# Altium footprint library 6-Connectors-6.PcbLib: 117 footprints (part 2 of 8)
Each footprint in its own frame and in the unit in brackets; x right, y up, seen from the top. Pads: shape width x height; smd on the part's side, far side on the other; paste and mask are expansions set on the pad; w line width, h text height; cw(c..) or ccw(c..) is an arc to the next point about the centre after c.
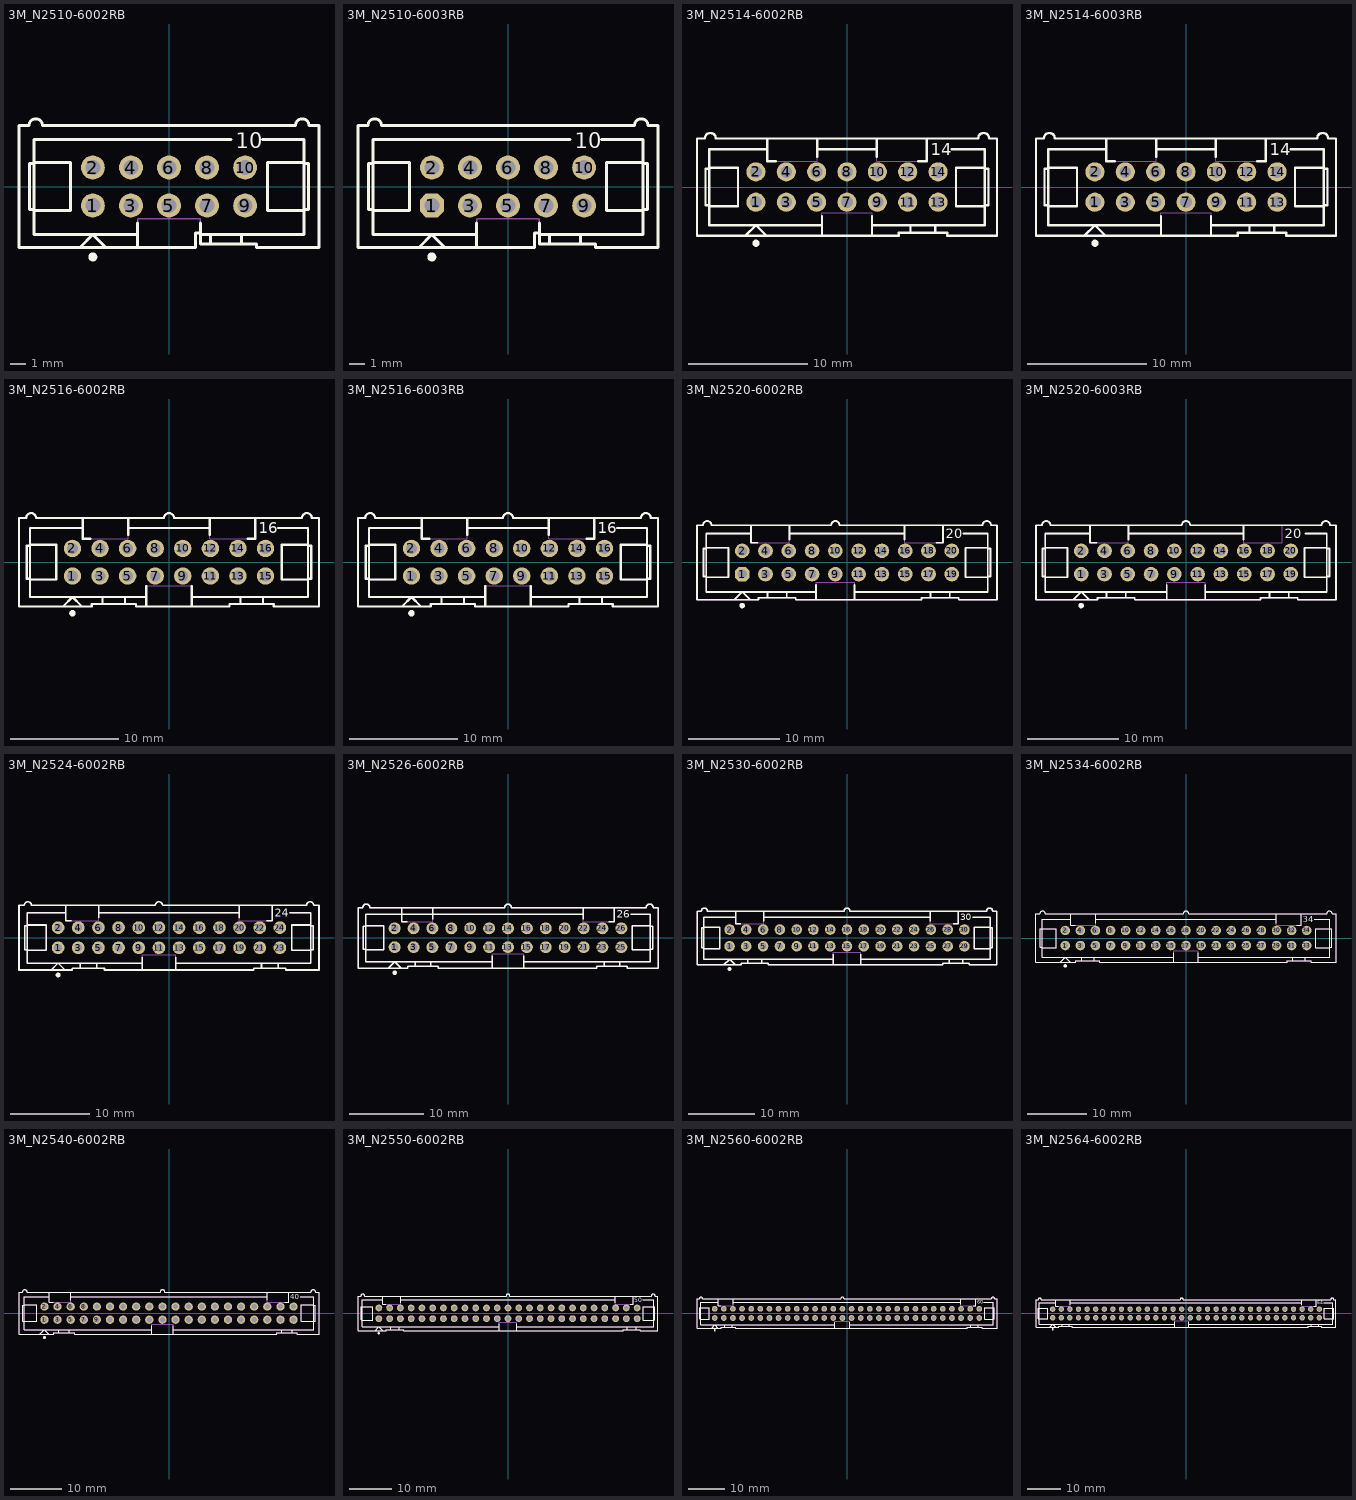
[diagram p1: the footprints below, top view; thin cyan lines are the x and y axes]

## 3M_N2510-6002RB [mm] "10 Contacts - Straight .100\" x .100\" Low Profile Four-Wall Header"
height 10.03
pads (10):
  round 1.6 hole 1: 1(-5.08,-1.27) 2(-5.08,1.27) 3(-2.54,-1.27) 4(-2.54,1.27) 5(0,-1.27) 6(0,1.27) 7(2.54,-1.27) 8(2.54,1.27) 9(5.08,-1.27) 10(5.08,1.27)
Top Overlay:
  circle w0.3: c-5.08,-4.699 r0.15
  lines w0.2: -8.992,-1.603 -6.579,-1.603 -6.579,1.603 -8.992,1.603 ; -8.992,-1.524 -9.296,-1.524 -9.296,1.524 -8.992,1.524 ; -5.944,-4.064 -5.08,-3.2 -4.216,-4.064 ; -2.096,-4.064 -2.096,-2.438 ; -2.096,-3.2 -8.992,-3.2 -8.992,3.15 4.128,3.15 ; 2.095,-3.2 8.992,-3.2 8.992,3.15 6.223,3.15 ; 2.095,-3.102 1.778,-3.102 1.778,-4.064 -10.008,-4.064 -10.008,4.064 -9.347,4.064 cw(c-8.89,4.064) -8.433,4.064 8.433,4.064 cw(c8.89,4.064) 9.347,4.064 10.008,4.064 10.008,-4.064 5.842,-4.064 5.842,-3.835 2.095,-3.835 2.095,-2.438 ; 2.769,-3.835 2.769,-3.2 ; 4.851,-3.835 4.851,-3.2 ; 8.992,-1.603 6.579,-1.603 6.579,1.603 8.992,1.603 ; 8.992,-1.524 9.296,-1.524 9.296,1.524 8.992,1.524
  text "10" at 4.445,2.54 h1.02
Mechanical 14:
  lines w0.1: -8.992,-1.603 -6.579,-1.603 -6.579,1.603 -8.992,1.603 ; -8.992,-1.524 -9.296,-1.524 -9.296,1.524 -8.992,1.524 ; -5.944,-4.064 -5.08,-3.2 -4.216,-4.064 ; -2.096,-4.064 -2.096,-2.159 2.095,-2.159 2.095,-3.835 5.842,-3.835 5.842,-4.064 10.008,-4.064 10.008,4.064 9.347,4.064 ccw(c8.89,4.064) 8.433,4.064 -8.433,4.064 ccw(c-8.89,4.064) -9.347,4.064 -10.008,4.064 -10.008,-4.064 1.778,-4.064 1.778,-3.102 2.095,-3.102 ; -2.096,-3.2 -8.992,-3.2 -8.992,3.15 4.128,3.15 ; 2.095,-3.2 8.992,-3.2 8.992,3.15 6.223,3.15 ; 2.769,-3.835 2.769,-3.2 ; 4.851,-3.835 4.851,-3.2 ; 8.992,-1.603 6.579,-1.603 6.579,1.603 8.992,1.603 ; 8.992,-1.524 9.296,-1.524 9.296,1.524 8.992,1.524
  text "10" at 4.445,2.54 h1.02
3D body "3M_N2510-6002RB.stp": height 9.65, standoff -2.59, extent -10.008,-4.064 10.008,4.572

## 3M_N2510-6003RB [mm] "10 Contacts - Straight .100\" x .100\" Low Profile Four-Wall Header (Solder Tail 3.94mm)"
height 10.03
pads (10):
  oct 1.6x1.6 hole 1: 1(-5.08,-1.27)
  round 1.6 hole 1: 2(-5.08,1.27) 3(-2.54,-1.27) 4(-2.54,1.27) 5(0,-1.27) 6(0,1.27) 7(2.54,-1.27) 8(2.54,1.27) 9(5.08,-1.27) 10(5.08,1.27)
Top Overlay:
  circle w0.3: c-5.08,-4.699 r0.15
  lines w0.2: -8.992,-1.603 -6.579,-1.603 -6.579,1.603 -8.992,1.603 ; -8.992,-1.524 -9.296,-1.524 -9.296,1.524 -8.992,1.524 ; -5.944,-4.064 -5.08,-3.2 -4.216,-4.064 ; -2.096,-4.064 -2.096,-2.438 ; -2.096,-3.2 -8.992,-3.2 -8.992,3.15 4.128,3.15 ; 2.095,-3.2 8.992,-3.2 8.992,3.15 6.223,3.15 ; 2.095,-3.102 1.778,-3.102 1.778,-4.064 -10.008,-4.064 -10.008,4.064 -9.347,4.064 cw(c-8.89,4.064) -8.433,4.064 8.433,4.064 cw(c8.89,4.064) 9.347,4.064 10.008,4.064 10.008,-4.064 5.842,-4.064 5.842,-3.835 2.095,-3.835 2.095,-2.438 ; 2.769,-3.835 2.769,-3.2 ; 4.851,-3.835 4.851,-3.2 ; 8.992,-1.603 6.579,-1.603 6.579,1.603 8.992,1.603 ; 8.992,-1.524 9.296,-1.524 9.296,1.524 8.992,1.524
  text "10" at 4.445,2.54 h1.02
Mechanical 14:
  lines w0.1: -8.992,-1.603 -6.579,-1.603 -6.579,1.603 -8.992,1.603 ; -8.992,-1.524 -9.296,-1.524 -9.296,1.524 -8.992,1.524 ; -5.944,-4.064 -5.08,-3.2 -4.216,-4.064 ; -2.096,-4.064 -2.096,-2.159 2.095,-2.159 2.095,-3.835 5.842,-3.835 5.842,-4.064 10.008,-4.064 10.008,4.064 9.347,4.064 ccw(c8.89,4.064) 8.433,4.064 -8.433,4.064 ccw(c-8.89,4.064) -9.347,4.064 -10.008,4.064 -10.008,-4.064 1.778,-4.064 1.778,-3.102 2.095,-3.102 ; -2.096,-3.2 -8.992,-3.2 -8.992,3.15 4.128,3.15 ; 2.095,-3.2 8.992,-3.2 8.992,3.15 6.223,3.15 ; 2.769,-3.835 2.769,-3.2 ; 4.851,-3.835 4.851,-3.2 ; 8.992,-1.603 6.579,-1.603 6.579,1.603 8.992,1.603 ; 8.992,-1.524 9.296,-1.524 9.296,1.524 8.992,1.524
  text "10" at 4.445,2.54 h1.02
3D body "3M_N2510-6003RB.stp": height 9.65, standoff -3.1, extent -10.008,-4.064 10.008,4.572
3D body "m20-254via.stp": height 0.1, standoff -1.82, extent -5.93,-2.12 -4.23,-0.42
3D body "m20-254via.stp": height 0.1, standoff -1.82, extent -5.93,0.42 -4.23,2.12
3D body "m20-254via.stp": height 0.1, standoff -1.82, extent -3.39,0.42 -1.69,2.12
3D body "m20-254via.stp": height 0.1, standoff -1.82, extent -3.39,-2.12 -1.69,-0.42
3D body "m20-254via.stp": height 0.1, standoff -1.82, extent -0.85,-2.12 0.85,-0.42
3D body "m20-254via.stp": height 0.1, standoff -1.82, extent -0.85,0.42 0.85,2.12
3D body "m20-254via.stp": height 0.1, standoff -1.82, extent 1.69,-2.12 3.39,-0.42
3D body "m20-254via.stp": height 0.1, standoff -1.82, extent 1.69,0.42 3.39,2.12
3D body "m20-254via.stp": height 0.1, standoff -1.82, extent 4.23,0.42 5.93,2.12
3D body "m20-254via.stp": height 0.1, standoff -1.82, extent 4.23,-2.12 5.93,-0.42

## 3M_N2514-6002RB [mm] "14 Contacts - Straight .100\" x .100\" Low Profile Four-Wall Header"
height 10.03
pads (14):
  round 1.6 hole 1: 1(-7.62,-1.27) 2(-7.62,1.27) 3(-5.08,-1.27) 4(-5.08,1.27) 5(-2.54,-1.27) 6(-2.54,1.27) 7(0,-1.27) 8(0,1.27) 9(2.54,-1.27) 10(2.54,1.27) 11(5.08,-1.27) 12(5.08,1.27) 13(7.62,-1.27) 14(7.62,1.27)
Top Overlay:
  circle w0.3: c-7.62,-4.699 r0.15
  lines w0.2: -11.532,-1.603 -9.119,-1.603 -9.119,1.603 -11.532,1.603 ; -11.532,-1.524 -11.836,-1.524 -11.836,1.524 -11.532,1.524 ; -8.484,-4.064 -7.62,-3.2 -6.756,-4.064 ; -6.668,3.15 -11.532,3.15 -11.532,-3.2 -2.096,-3.2 ; -6.668,4.064 -6.668,2.159 -5.959,2.159 ; -2.477,2.518 -2.477,4.064 ; -2.477,3.15 2.476,3.15 ; -2.096,-4.064 -2.096,-2.438 ; 2.095,-4.064 2.095,-2.438 ; 2.095,-3.2 11.532,-3.2 11.532,3.15 8.763,3.15 ; 2.476,2.518 2.476,4.064 ; 5.309,-3.835 5.309,-3.2 ; 5.959,2.159 6.668,2.159 6.668,4.064 ; 7.391,-3.835 7.391,-3.2 ; 11.532,-1.603 9.119,-1.603 9.119,1.603 11.532,1.603 ; 11.532,-1.524 11.836,-1.524 11.836,1.524 11.532,1.524 ; -12.548,-4.064 -12.548,4.064 -11.887,4.064 cw(c-11.43,4.064) -10.973,4.064 10.973,4.064 cw(c11.43,4.064) 11.887,4.064 12.548,4.064 12.548,-4.064 8.382,-4.064 8.382,-3.835 4.318,-3.835 4.318,-4.064 -12.548,-4.064
  text "14" at 6.985,2.667 h1.02
Mechanical 14:
  lines w0.1: -11.532,-1.603 -9.119,-1.603 -9.119,1.603 -11.532,1.603 ; -11.532,-1.524 -11.836,-1.524 -11.836,1.524 -11.532,1.524 ; -8.484,-4.064 -7.62,-3.2 -6.756,-4.064 ; -6.668,3.15 -11.532,3.15 -11.532,-3.2 -2.096,-3.2 ; -6.668,4.064 -6.668,2.159 -2.477,2.159 -2.477,4.064 ; -2.477,3.15 2.476,3.15 ; -2.096,-4.064 -2.096,-2.159 2.095,-2.159 2.095,-4.064 ; 2.095,-3.2 11.532,-3.2 11.532,3.15 8.763,3.15 ; 2.476,4.064 2.476,2.159 6.668,2.159 6.668,4.064 ; 5.309,-3.835 5.309,-3.2 ; 7.391,-3.835 7.391,-3.2 ; 11.532,-1.603 9.119,-1.603 9.119,1.603 11.532,1.603 ; 11.532,-1.524 11.836,-1.524 11.836,1.524 11.532,1.524 ; -12.548,-4.064 -12.548,4.064 -11.887,4.064 cw(c-11.43,4.064) -10.973,4.064 10.973,4.064 cw(c11.43,4.064) 11.887,4.064 12.548,4.064 12.548,-4.064 8.382,-4.064 8.382,-3.835 4.318,-3.835 4.318,-4.064 -12.548,-4.064
  text "14" at 6.985,2.667 h1.02
3D body "3M_N2514-6002RB.stp": height 9.65, standoff -2.59, extent -12.548,-4.064 12.548,4.572

## 3M_N2514-6003RB [mm] "14 Contacts - Straight .100\" x .100\" Low Profile Four-Wall Header (Solder Tail 3.94mm)"
height 10.03
pads (14):
  round 1.6 hole 1: 1(-7.62,-1.27) 2(-7.62,1.27) 3(-5.08,-1.27) 4(-5.08,1.27) 5(-2.54,-1.27) 6(-2.54,1.27) 7(0,-1.27) 8(0,1.27) 9(2.54,-1.27) 10(2.54,1.27) 11(5.08,-1.27) 12(5.08,1.27) 13(7.62,-1.27) 14(7.62,1.27)
Top Overlay:
  circle w0.3: c-7.62,-4.699 r0.15
  lines w0.2: -11.532,-1.603 -9.119,-1.603 -9.119,1.603 -11.532,1.603 ; -11.532,-1.524 -11.836,-1.524 -11.836,1.524 -11.532,1.524 ; -8.484,-4.064 -7.62,-3.2 -6.756,-4.064 ; -6.668,3.15 -11.532,3.15 -11.532,-3.2 -2.096,-3.2 ; -6.668,4.064 -6.668,2.159 -5.959,2.159 ; -2.477,2.518 -2.477,4.064 ; -2.477,3.15 2.476,3.15 ; -2.096,-4.064 -2.096,-2.438 ; 2.095,-4.064 2.095,-2.438 ; 2.095,-3.2 11.532,-3.2 11.532,3.15 8.763,3.15 ; 2.476,2.518 2.476,4.064 ; 5.309,-3.835 5.309,-3.2 ; 5.959,2.159 6.668,2.159 6.668,4.064 ; 7.391,-3.835 7.391,-3.2 ; 11.532,-1.603 9.119,-1.603 9.119,1.603 11.532,1.603 ; 11.532,-1.524 11.836,-1.524 11.836,1.524 11.532,1.524 ; -12.548,-4.064 4.318,-4.064 4.318,-3.835 8.382,-3.835 8.382,-4.064 12.548,-4.064 12.548,4.064 11.887,4.064 ccw(c11.43,4.064) 10.973,4.064 -10.973,4.064 ccw(c-11.43,4.064) -11.887,4.064 -12.548,4.064 -12.548,-4.064
  text "14" at 6.985,2.667 h1.02
Mechanical 14:
  lines w0.1: -11.532,-1.603 -9.119,-1.603 -9.119,1.603 -11.532,1.603 ; -11.532,-1.524 -11.836,-1.524 -11.836,1.524 -11.532,1.524 ; -8.484,-4.064 -7.62,-3.2 -6.756,-4.064 ; -6.668,3.15 -11.532,3.15 -11.532,-3.2 -2.096,-3.2 ; -6.668,4.064 -6.668,2.159 -2.477,2.159 -2.477,4.064 ; -2.477,3.15 2.476,3.15 ; -2.096,-4.064 -2.096,-2.159 2.095,-2.159 2.095,-4.064 ; 2.095,-3.2 11.532,-3.2 11.532,3.15 8.763,3.15 ; 2.476,4.064 2.476,2.159 6.668,2.159 6.668,4.064 ; 5.309,-3.835 5.309,-3.2 ; 7.391,-3.835 7.391,-3.2 ; 11.532,-1.603 9.119,-1.603 9.119,1.603 11.532,1.603 ; 11.532,-1.524 11.836,-1.524 11.836,1.524 11.532,1.524 ; -12.548,-4.064 4.318,-4.064 4.318,-3.835 8.382,-3.835 8.382,-4.064 12.548,-4.064 12.548,4.064 11.887,4.064 ccw(c11.43,4.064) 10.973,4.064 -10.973,4.064 ccw(c-11.43,4.064) -11.887,4.064 -12.548,4.064 -12.548,-4.064
  text "14" at 6.985,2.667 h1.02
3D body "3M_N2514-6003RB.stp": height 9.65, standoff -3.1, extent -12.548,-4.064 12.548,4.572

## 3M_N2516-6002RB [mm] "16 Contacts - Straight .100\" x .100\" Low Profile Four-Wall Header"
height 10.03
pads (16):
  round 1.6 hole 1: 1(-8.89,-1.27) 2(-8.89,1.27) 3(-6.35,-1.27) 4(-6.35,1.27) 5(-3.81,-1.27) 6(-3.81,1.27) 7(-1.27,-1.27) 8(-1.27,1.27) 9(1.27,-1.27) 10(1.27,1.27) 11(3.81,-1.27) 12(3.81,1.27) 13(6.35,-1.27) 14(6.35,1.27) 15(8.89,-1.27) 16(8.89,1.27)
Top Overlay:
  circle w0.3: c-8.89,-4.699 r0.15
  lines w0.2: -12.802,-1.603 -10.389,-1.603 -10.389,1.603 -12.802,1.603 ; -12.802,-1.524 -13.106,-1.524 -13.106,1.524 -12.802,1.524 ; -9.754,-4.064 -8.89,-3.2 -8.026,-4.064 ; -7.938,3.15 -12.802,3.15 -12.802,-3.2 -2.096,-3.2 ; -7.938,4.064 -7.938,2.159 -7.229,2.159 ; -6.121,-3.835 -6.121,-3.2 ; -4.039,-3.835 -4.039,-3.2 ; -3.747,2.518 -3.747,4.064 ; -3.747,3.15 3.747,3.15 ; -2.096,-4.064 -2.096,-2.209 ; 2.095,-4.064 2.095,-2.209 ; 2.095,-3.2 12.802,-3.2 12.802,3.15 10.033,3.15 ; 3.747,2.518 3.747,4.064 ; 6.579,-3.835 6.579,-3.2 ; 7.229,2.159 7.938,2.159 7.938,4.064 ; 8.661,-3.835 8.661,-3.2 ; 12.802,-1.603 10.389,-1.603 10.389,1.603 12.802,1.603 ; 12.802,-1.524 13.106,-1.524 13.106,1.524 12.802,1.524 ; -13.818,-4.064 -7.112,-4.064 -7.112,-3.835 -3.048,-3.835 -3.048,-4.064 5.588,-4.064 5.588,-3.835 9.652,-3.835 9.652,-4.064 13.818,-4.064 13.818,4.064 13.157,4.064 ccw(c12.7,4.064) 12.243,4.064 0.457,4.064 ccw(c0,4.064) -0.457,4.064 -12.243,4.064 ccw(c-12.7,4.064) -13.157,4.064 -13.818,4.064 -13.818,-4.064
  text "16" at 8.255,2.667 h1.02
Mechanical 14:
  lines w0.1: -12.802,-1.603 -10.389,-1.603 -10.389,1.603 -12.802,1.603 ; -12.802,-1.524 -13.106,-1.524 -13.106,1.524 -12.802,1.524 ; -9.754,-4.064 -8.89,-3.2 -8.026,-4.064 ; -7.938,3.15 -12.802,3.15 -12.802,-3.2 -2.096,-3.2 ; -7.938,4.064 -7.938,2.159 -3.747,2.159 -3.747,4.064 ; -6.121,-3.835 -6.121,-3.2 ; -4.039,-3.835 -4.039,-3.2 ; -3.747,3.15 3.747,3.15 ; -2.096,-4.064 -2.096,-2.159 2.095,-2.159 2.095,-4.064 ; 2.095,-3.2 12.802,-3.2 12.802,3.15 10.033,3.15 ; 3.747,4.064 3.747,2.159 7.938,2.159 7.938,4.064 ; 6.579,-3.835 6.579,-3.2 ; 8.661,-3.835 8.661,-3.2 ; 12.802,-1.603 10.389,-1.603 10.389,1.603 12.802,1.603 ; 12.802,-1.524 13.106,-1.524 13.106,1.524 12.802,1.524 ; -13.818,-4.064 -7.112,-4.064 -7.112,-3.835 -3.048,-3.835 -3.048,-4.064 5.588,-4.064 5.588,-3.835 9.652,-3.835 9.652,-4.064 13.818,-4.064 13.818,4.064 13.157,4.064 ccw(c12.7,4.064) 12.243,4.064 0.457,4.064 ccw(c0,4.064) -0.457,4.064 -12.243,4.064 ccw(c-12.7,4.064) -13.157,4.064 -13.818,4.064 -13.818,-4.064
  text "16" at 8.255,2.667 h1.02
3D body "3M_N2516-6002RB.stp": height 9.65, standoff -2.59, extent -13.818,-4.064 13.818,4.572

## 3M_N2516-6003RB [mm] "16 Contacts - Straight .100\" x .100\" Low Profile Four-Wall Header (Solder Tail 3.94mm)"
height 10.03
pads (16):
  round 1.6 hole 1: 1(-8.89,-1.27) 2(-8.89,1.27) 3(-6.35,-1.27) 4(-6.35,1.27) 5(-3.81,-1.27) 6(-3.81,1.27) 7(-1.27,-1.27) 8(-1.27,1.27) 9(1.27,-1.27) 10(1.27,1.27) 11(3.81,-1.27) 12(3.81,1.27) 13(6.35,-1.27) 14(6.35,1.27) 15(8.89,-1.27) 16(8.89,1.27)
Top Overlay:
  circle w0.3: c-8.89,-4.699 r0.15
  lines w0.2: -12.802,-1.603 -10.389,-1.603 -10.389,1.603 -12.802,1.603 ; -12.802,-1.524 -13.106,-1.524 -13.106,1.524 -12.802,1.524 ; -9.754,-4.064 -8.89,-3.2 -8.026,-4.064 ; -7.938,3.15 -12.802,3.15 -12.802,-3.2 -2.096,-3.2 ; -7.938,4.064 -7.938,2.159 -7.229,2.159 ; -6.121,-3.835 -6.121,-3.2 ; -4.039,-3.835 -4.039,-3.2 ; -3.747,2.518 -3.747,4.064 ; -3.747,3.15 3.747,3.15 ; -2.096,-4.064 -2.096,-2.209 ; 2.095,-4.064 2.095,-2.209 ; 2.095,-3.2 12.802,-3.2 12.802,3.15 10.033,3.15 ; 3.747,2.518 3.747,4.064 ; 6.579,-3.835 6.579,-3.2 ; 7.229,2.159 7.938,2.159 7.938,4.064 ; 8.661,-3.835 8.661,-3.2 ; 12.802,-1.603 10.389,-1.603 10.389,1.603 12.802,1.603 ; 12.802,-1.524 13.106,-1.524 13.106,1.524 12.802,1.524 ; -13.818,-4.064 -13.818,4.064 -13.157,4.064 cw(c-12.7,4.064) -12.243,4.064 -0.457,4.064 cw(c0,4.064) 0.457,4.064 12.243,4.064 cw(c12.7,4.064) 13.157,4.064 13.818,4.064 13.818,-4.064 9.652,-4.064 9.652,-3.835 5.588,-3.835 5.588,-4.064 -3.048,-4.064 -3.048,-3.835 -7.112,-3.835 -7.112,-4.064 -13.818,-4.064
  text "16" at 8.255,2.667 h1.02
Mechanical 14:
  lines w0.1: -12.802,-1.603 -10.389,-1.603 -10.389,1.603 -12.802,1.603 ; -12.802,-1.524 -13.106,-1.524 -13.106,1.524 -12.802,1.524 ; -9.754,-4.064 -8.89,-3.2 -8.026,-4.064 ; -7.938,3.15 -12.802,3.15 -12.802,-3.2 -2.096,-3.2 ; -7.938,4.064 -7.938,2.159 -3.747,2.159 -3.747,4.064 ; -6.121,-3.835 -6.121,-3.2 ; -4.039,-3.835 -4.039,-3.2 ; -3.747,3.15 3.747,3.15 ; -2.096,-4.064 -2.096,-2.159 2.095,-2.159 2.095,-4.064 ; 2.095,-3.2 12.802,-3.2 12.802,3.15 10.033,3.15 ; 3.747,4.064 3.747,2.159 7.938,2.159 7.938,4.064 ; 6.579,-3.835 6.579,-3.2 ; 8.661,-3.835 8.661,-3.2 ; 12.802,-1.603 10.389,-1.603 10.389,1.603 12.802,1.603 ; 12.802,-1.524 13.106,-1.524 13.106,1.524 12.802,1.524 ; -13.818,-4.064 -13.818,4.064 -13.157,4.064 cw(c-12.7,4.064) -12.243,4.064 -0.457,4.064 cw(c0,4.064) 0.457,4.064 12.243,4.064 cw(c12.7,4.064) 13.157,4.064 13.818,4.064 13.818,-4.064 9.652,-4.064 9.652,-3.835 5.588,-3.835 5.588,-4.064 -3.048,-4.064 -3.048,-3.835 -7.112,-3.835 -7.112,-4.064 -13.818,-4.064
  text "16" at 8.255,2.667 h1.02
3D body "3M_N2516-6003RB.stp": height 9.65, standoff -3.1, extent -13.818,-4.064 13.818,4.572

## 3M_N2520-6002RB [mm] "20 Contacts - Straight .100\" x .100\" Low Profile Four-Wall Header"
height 10.03
pads (20):
  oct 1.6x1.6 hole 1: 1(-11.43,-1.27)
  round 1.6 hole 1: 2(-11.43,1.27) 3(-8.89,-1.27) 4(-8.89,1.27) 5(-6.35,-1.27) 6(-6.35,1.27) 7(-3.81,-1.27) 8(-3.81,1.27) 9(-1.27,-1.27) 10(-1.27,1.27) 11(1.27,-1.27) 12(1.27,1.27) 13(3.81,-1.27) 14(3.81,1.27) 15(6.35,-1.27) 16(6.35,1.27) 17(8.89,-1.27) 18(8.89,1.27) 19(11.43,-1.27) 20(11.43,1.27)
Top Overlay:
  circle w0.3: c-11.43,-4.699 r0.15
  lines w0.2: -15.342,-1.603 -12.929,-1.603 -12.929,1.603 -15.342,1.603 ; -15.342,-1.524 -15.646,-1.524 -15.646,1.524 -15.342,1.524 ; -12.294,-4.064 -11.43,-3.2 -10.566,-4.064 ; -10.478,3.15 -15.342,3.15 -15.342,-3.2 -3.366,-3.2 ; -10.478,4.064 -10.478,2.159 -9.769,2.159 ; -8.661,-3.835 -8.661,-3.2 ; -6.579,-3.835 -6.579,-3.2 ; -6.287,2.518 -6.287,4.064 ; -6.287,3.15 6.287,3.15 ; -3.366,-4.064 -3.366,-2.438 ; 0.826,-4.064 0.826,-2.438 ; 0.826,-3.2 15.342,-3.2 15.342,3.15 12.7,3.15 ; 6.287,2.518 6.287,4.064 ; 9.119,-3.835 9.119,-3.2 ; 9.769,2.159 10.478,2.159 10.478,4.064 ; 11.201,-3.835 11.201,-3.2 ; 15.342,-1.603 12.929,-1.603 12.929,1.603 15.342,1.603 ; 15.342,-1.524 15.646,-1.524 15.646,1.524 15.342,1.524 ; -16.358,-4.064 -16.358,4.064 -15.697,4.064 cw(c-15.24,4.064) -14.783,4.064 -1.727,4.064 cw(c-1.27,4.064) -0.813,4.064 14.783,4.064 cw(c15.24,4.064) 15.697,4.064 16.358,4.064 16.358,-4.064 12.192,-4.064 12.192,-3.835 8.128,-3.835 8.128,-4.064 -5.588,-4.064 -5.588,-3.835 -9.652,-3.835 -9.652,-4.064 -16.358,-4.064
  text "20" at 10.795,2.667 h1.02
Mechanical 14:
  lines w0.1: -15.342,-1.603 -12.929,-1.603 -12.929,1.603 -15.342,1.603 ; -15.342,-1.524 -15.646,-1.524 -15.646,1.524 -15.342,1.524 ; -12.294,-4.064 -11.43,-3.2 -10.566,-4.064 ; -10.478,3.15 -15.342,3.15 -15.342,-3.2 -3.366,-3.2 ; -10.478,4.064 -10.478,2.159 -6.287,2.159 -6.287,4.064 ; -8.661,-3.835 -8.661,-3.2 ; -6.579,-3.835 -6.579,-3.2 ; -6.287,3.15 6.287,3.15 ; -3.366,-4.064 -3.366,-2.159 0.826,-2.159 0.826,-4.064 ; 0.826,-3.2 15.342,-3.2 15.342,3.15 12.7,3.15 ; 6.287,4.064 6.287,2.159 10.478,2.159 10.478,4.064 ; 9.119,-3.835 9.119,-3.2 ; 11.201,-3.835 11.201,-3.2 ; 15.342,-1.603 12.929,-1.603 12.929,1.603 15.342,1.603 ; 15.342,-1.524 15.646,-1.524 15.646,1.524 15.342,1.524 ; -16.358,-4.064 -16.358,4.064 -15.697,4.064 cw(c-15.24,4.064) -14.783,4.064 -1.727,4.064 cw(c-1.27,4.064) -0.813,4.064 14.783,4.064 cw(c15.24,4.064) 15.697,4.064 16.358,4.064 16.358,-4.064 12.192,-4.064 12.192,-3.835 8.128,-3.835 8.128,-4.064 -5.588,-4.064 -5.588,-3.835 -9.652,-3.835 -9.652,-4.064 -16.358,-4.064
  text "20" at 10.795,2.667 h1.02
3D body "3M_N2520-6002RB.stp": height 9.65, standoff -2.59, extent -16.358,-4.064 16.358,4.572
3D body "m20-254via.stp": height 0.1, standoff -1.82, extent -12.28,-2.12 -10.58,-0.42
3D body "m20-254via.stp": height 0.1, standoff -1.82, extent -12.28,0.42 -10.58,2.12
3D body "m20-254via.stp": height 0.1, standoff -1.82, extent -9.74,0.42 -8.04,2.12
3D body "m20-254via.stp": height 0.1, standoff -1.82, extent -7.2,0.42 -5.5,2.12
3D body "m20-254via.stp": height 0.1, standoff -1.82, extent -9.74,-2.12 -8.04,-0.42
3D body "m20-254via.stp": height 0.1, standoff -1.82, extent -7.2,-2.12 -5.5,-0.42
3D body "m20-254via.stp": height 0.1, standoff -1.82, extent -4.66,-2.12 -2.96,-0.42
3D body "m20-254via.stp": height 0.1, standoff -1.82, extent -4.66,0.42 -2.96,2.12
3D body "m20-254via.stp": height 0.1, standoff -1.82, extent -2.12,-2.12 -0.42,-0.42
3D body "m20-254via.stp": height 0.1, standoff -1.82, extent -2.12,0.42 -0.42,2.12
3D body "m20-254via.stp": height 0.1, standoff -1.82, extent 0.42,-2.12 2.12,-0.42
3D body "m20-254via.stp": height 0.1, standoff -1.82, extent 0.42,0.42 2.12,2.12
3D body "m20-254via.stp": height 0.1, standoff -1.82, extent 2.96,-2.12 4.66,-0.42
3D body "m20-254via.stp": height 0.1, standoff -1.82, extent 2.96,0.42 4.66,2.12
3D body "m20-254via.stp": height 0.1, standoff -1.82, extent 5.5,0.42 7.2,2.12
3D body "m20-254via.stp": height 0.1, standoff -1.82, extent 5.5,-2.12 7.2,-0.42
3D body "m20-254via.stp": height 0.1, standoff -1.82, extent 8.04,-2.12 9.74,-0.42
3D body "m20-254via.stp": height 0.1, standoff -1.82, extent 8.04,0.42 9.74,2.12
3D body "m20-254via.stp": height 0.1, standoff -1.82, extent 10.58,0.42 12.28,2.12
3D body "m20-254via.stp": height 0.1, standoff -1.82, extent 10.58,-2.12 12.28,-0.42

## 3M_N2520-6003RB [mm] "20 Contacts - Straight .100\" x .100\" Low Profile Four-Wall Header (Solder Tail 3.94mm)"
height 10.03
pads (20):
  round 1.6 hole 1: 1(-11.43,-1.27) 2(-11.43,1.27) 3(-8.89,-1.27) 4(-8.89,1.27) 5(-6.35,-1.27) 6(-6.35,1.27) 7(-3.81,-1.27) 8(-3.81,1.27) 9(-1.27,-1.27) 10(-1.27,1.27) 11(1.27,-1.27) 12(1.27,1.27) 13(3.81,-1.27) 14(3.81,1.27) 15(6.35,-1.27) 16(6.35,1.27) 17(8.89,-1.27) 18(8.89,1.27) 19(11.43,-1.27) 20(11.43,1.27)
Top Overlay:
  circle w0.3: c-11.43,-4.699 r0.15
  lines w0.2: -15.342,-1.603 -12.929,-1.603 -12.929,1.603 -15.342,1.603 ; -15.342,-1.524 -15.646,-1.524 -15.646,1.524 -15.342,1.524 ; -12.294,-4.064 -11.43,-3.2 -10.566,-4.064 ; -10.478,3.15 -15.342,3.15 -15.342,-3.2 -2.096,-3.2 ; -10.478,4.064 -10.478,2.159 -9.769,2.159 ; -8.661,-3.835 -8.661,-3.2 ; -6.579,-3.835 -6.579,-3.2 ; -6.287,2.518 -6.287,4.064 ; -6.287,3.15 6.287,3.15 ; -2.096,-4.064 -2.096,-2.438 ; 2.095,-4.064 2.095,-2.438 ; 2.095,-3.2 15.342,-3.2 15.342,3.15 13.018,3.15 ; 6.287,2.518 6.287,4.064 ; 9.119,-3.835 9.119,-3.2 ; 11.201,-3.835 11.201,-3.2 ; 15.342,-1.603 12.929,-1.603 12.929,1.603 15.342,1.603 ; 15.342,-1.524 15.646,-1.524 15.646,1.524 15.342,1.524 ; -16.358,-4.064 -16.358,4.064 -15.697,4.064 cw(c-15.24,4.064) -14.783,4.064 -0.457,4.064 cw(c0,4.064) 0.457,4.064 14.783,4.064 cw(c15.24,4.064) 15.697,4.064 16.358,4.064 16.358,-4.064 12.192,-4.064 12.192,-3.835 8.128,-3.835 8.128,-4.064 -5.588,-4.064 -5.588,-3.835 -9.652,-3.835 -9.652,-4.064 -16.358,-4.064
  text "20" at 10.795,2.667 h1.02
Mechanical 14:
  lines w0.1: -15.342,-1.603 -12.929,-1.603 -12.929,1.603 -15.342,1.603 ; -15.342,-1.524 -15.646,-1.524 -15.646,1.524 -15.342,1.524 ; -12.294,-4.064 -11.43,-3.2 -10.566,-4.064 ; -10.478,3.15 -15.342,3.15 -15.342,-3.2 -2.096,-3.2 ; -10.478,4.064 -10.478,2.159 -6.287,2.159 -6.287,4.064 ; -8.661,-3.835 -8.661,-3.2 ; -6.579,-3.835 -6.579,-3.2 ; -6.287,3.15 6.287,3.15 ; -2.096,-4.064 -2.096,-2.159 2.095,-2.159 2.095,-4.064 ; 2.095,-3.2 15.342,-3.2 15.342,3.15 13.018,3.15 ; 6.287,4.064 6.287,2.159 10.478,2.159 10.478,4.064 ; 9.119,-3.835 9.119,-3.2 ; 11.201,-3.835 11.201,-3.2 ; 15.342,-1.603 12.929,-1.603 12.929,1.603 15.342,1.603 ; 15.342,-1.524 15.646,-1.524 15.646,1.524 15.342,1.524 ; -16.358,-4.064 -16.358,4.064 -15.697,4.064 cw(c-15.24,4.064) -14.783,4.064 -0.457,4.064 cw(c0,4.064) 0.457,4.064 14.783,4.064 cw(c15.24,4.064) 15.697,4.064 16.358,4.064 16.358,-4.064 12.192,-4.064 12.192,-3.835 8.128,-3.835 8.128,-4.064 -5.588,-4.064 -5.588,-3.835 -9.652,-3.835 -9.652,-4.064 -16.358,-4.064